# Altium footprint library BKRES_PcbLib.PcbLib: 33 footprints (part 3 of 3)
Each footprint in its own frame and in the unit in brackets; x right, y up, seen from the top. Pads: shape width x height; smd on the part's side, far side on the other; paste and mask are expansions set on the pad; w line width, h text height; cw(c..) or ccw(c..) is an arc to the next point about the centre after c.
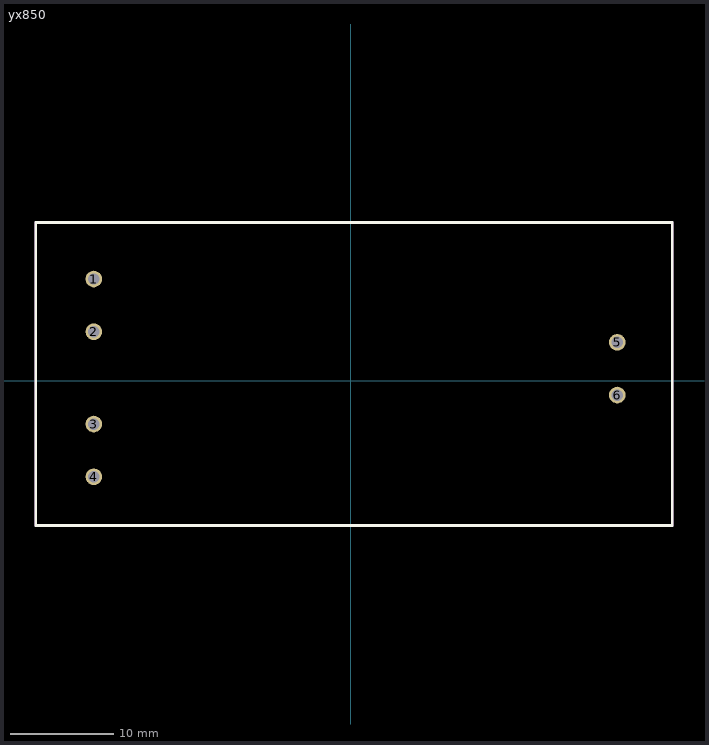
[diagram p2: the footprint, top view; thin cyan lines are the x and y axes]

## yx850 [mm]
pads (6):
  round 1.6 hole 1.1: 1(-24.765,9.779) 2(-24.765,4.699) 3(-24.765,-4.191) 4(-24.765,-9.271) 5(25.654,3.683) 6(25.654,-1.397)
Top Overlay:
  lines w0.254: -30.353,-13.97 -30.353,15.23 30.947,15.23 30.947,-13.97 -30.353,-13.97
Mechanical 13:
  lines w0.254: -30.353,-13.97 30.947,-13.97 30.947,15.23 -30.353,15.23 -30.353,-13.97
3D body: height 29, standoff 11, extent -30.353,-13.97 30.988,15.24